# Altium footprint library FS_Footprints.PcbLib: 134 footprints (part 1 of 9)
Each footprint in its own frame and in the unit in brackets; x right, y up, seen from the top. Pads: shape width x height; smd on the part's side, far side on the other; paste and mask are expansions set on the pad; w line width, h text height; cw(c..) or ccw(c..) is an arc to the next point about the centre after c.
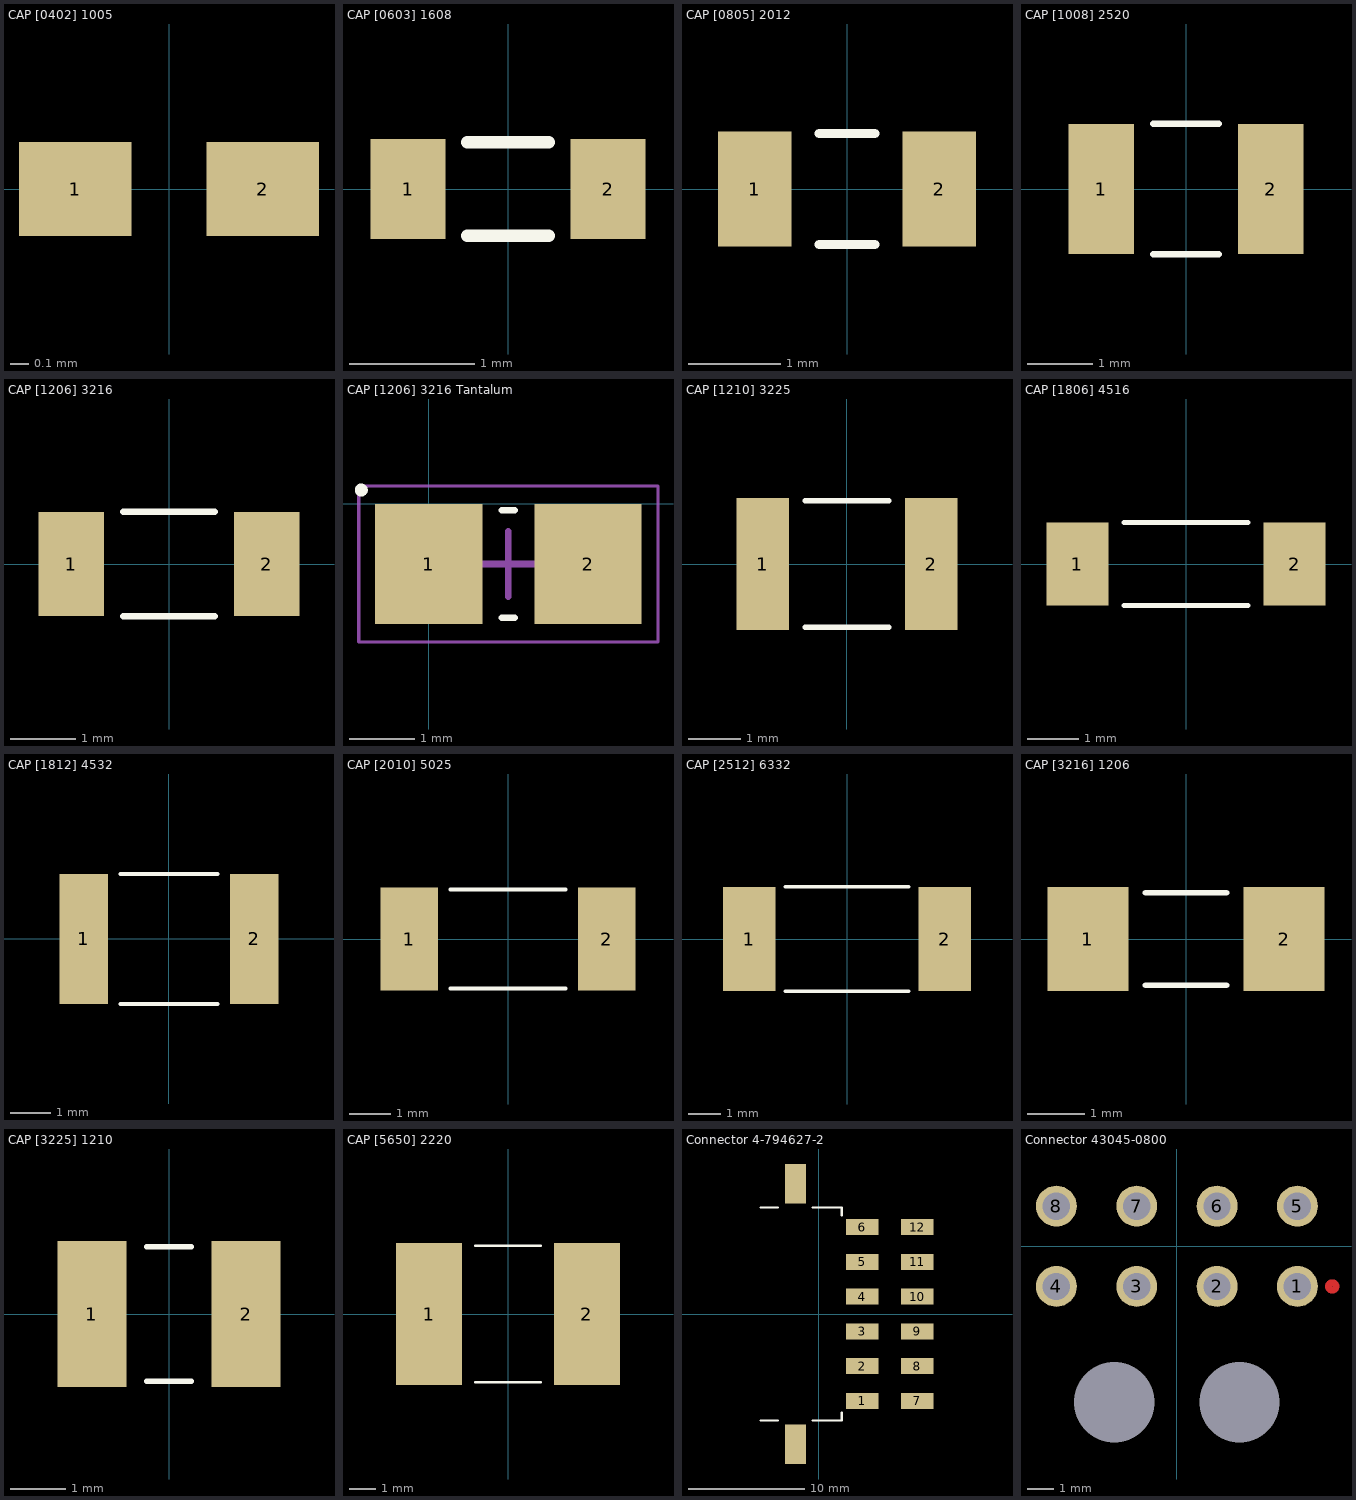
[diagram p0: the footprints below, top view; thin cyan lines are the x and y axes]

## CAP [0402] 1005 [mm]
pads (2):
  rect 0.6x0.5 smd: 1(-0.5,0) 2(0.5,0)
3D body "User Library-SMD CAPACITOR 0402.step": height 0.49, standoff -0.01, extent -0.5,-0.25 0.5,0.25

## CAP [0603] 1608 [mm]
pads (2):
  rect 0.6x0.8 smd: 1(-0.8,0) 2(0.8,0)
Top Overlay:
  lines w0.1: -0.325,-0.375 0.325,-0.375 ; -0.325,0.375 0.325,0.375
3D body "User Library-CerCaps 0603.step": height 0.81, standoff -0.01, extent -0.93,-0.412 0.93,0.413

## CAP [0805] 2012 [mm]
pads (2):
  rect 0.8x1.25 smd: 1(-1,0) 2(1,0)
Top Overlay:
  lines w0.1: -0.3,-0.6 0.3,-0.6 ; -0.3,0.6 0.3,0.6
3D body "User Library-CerCaps 0805.step": height 1.26, standoff -0.01, extent -1.088,-0.637 1.088,0.638

## CAP [1008] 2520 [mm]
pads (2):
  rect 1x2 smd: 1(-1.3,0) 2(1.3,0)
Top Overlay:
  lines w0.1: -0.5,-1 0.5,-1 ; -0.5,1 0.5,1
3D body "User Library-CerCaps 1008.step": height 2.01, standoff -0.01, extent -1.367,-1.012 1.367,1.013

## CAP [1206] 3216 [mm]
pads (2):
  rect 1x1.6 smd: 1(-1.5,0) 2(1.5,0)
Top Overlay:
  lines w0.1: -0.7,-0.8 0.7,-0.8 ; -0.7,0.8 0.7,0.8
3D body "User Library-CerCaps 1206.step": height 1.61, standoff -0.01, extent -1.746,-0.812 1.747,0.813

## CAP [1206] 3216 Tantalum [mm] "Chip Capacitor, 2-Leads, Body 3.20x1.65mm, IPC Medium Density"
height 1.8
pads (2):
  rect 1.65x1.85 smd: 1(0,-0.925) 2(2.45,-0.925)
Top Overlay:
  circle w0.1: c-1.037,0.212 r0.05
  lines w0.1: 1.125,-1.75 1.325,-1.75 ; 1.125,-0.1 1.325,-0.1
Mechanical 15:
  lines w0.05: -1.075,-2.125 -1.075,0.275 3.525,0.275 3.525,-2.125 -1.075,-2.125
  lines w0.1: 0.725,-0.925 1.725,-0.925 ; 1.225,-1.425 1.225,-0.425

## CAP [1210] 3225 [mm]
pads (2):
  rect 1x2.5 smd: 1(-1.6,0) 2(1.6,0)
Top Overlay:
  lines w0.1: -0.8,-1.2 0.8,-1.2 ; -0.8,1.2 0.8,1.2
3D body "User Library-SMD CAPACITOR 1210.step": height 0.79, standoff 0.01, extent -1.6,-1.25 1.6,1.25

## CAP [1806] 4516 [mm]
pads (2):
  rect 1.2x1.6 smd: 1(-2.1,0) 2(2.1,0)
Top Overlay:
  lines w0.1: -1.2,-0.8 1.2,-0.8 ; -1.2,0.8 1.2,0.8
3D body "User Library-CerCaps 1806.step": height 1.61, standoff -0.01, extent -2.426,-0.812 2.426,0.813

## CAP [1812] 4532 [mm]
pads (2):
  rect 1.2x3.2 smd: 1(-2.1,0) 2(2.1,0)
Top Overlay:
  lines w0.1: -1.2,-1.6 1.2,-1.6 ; -1.2,1.6 1.2,1.6
3D body "User Library-CerCaps 1812.step": height 3.21, standoff -0.01, extent -2.46,-1.612 2.46,1.613

## CAP [2010] 5025 [mm]
pads (2):
  rect 1.4x2.5 smd: 1(-2.4,0) 2(2.4,0)
Top Overlay:
  lines w0.1: -1.4,-1.2 1.4,-1.2 ; -1.4,1.2 1.4,1.2
3D body "User Library-CerCaps 2010.step": height 2.51, standoff -0.01, extent -2.74,-1.262 2.74,1.263

## CAP [2512] 6332 [mm]
pads (2):
  rect 1.6x3.2 smd: 1(-3,0) 2(3,0)
Top Overlay:
  lines w0.1: -1.9,-1.6 1.9,-1.6 ; -1.9,1.6 1.9,1.6
3D body "User Library-CerCaps 2512.step": height 3.21, standoff -0.01, extent -3.47,-1.612 3.47,1.613

## CAP [3216] 1206 [mm]
height 1.5
pads (2):
  rect 1.4x1.8 smd: 1(-1.7,0) 2(1.7,0)
Top Overlay:
  lines w0.1: -0.7,-0.8 0.7,-0.8 ; -0.7,0.8 0.7,0.8
3D body "User Library-SMD CAPACITOR.step": height 0.79, standoff 0.01, extent -1.6,-0.8 1.6,0.8

## CAP [3225] 1210 [mm] "Chip Capacitor, 2-Leads, Body 3.20x2.50mm, IPC Medium Density"
height 1
pads (2):
  rect 1.25x2.65 smd: 1(-1.4,0) 2(1.4,0)
Top Overlay:
  lines w0.1: -0.4,-1.225 0.4,-1.225 ; -0.4,1.225 0.4,1.225
3D body "User Library-SMD CAPACITOR 1210.step": height 0.79, standoff 0.01, extent -1.6,-1.25 1.6,1.25

## CAP [5650] 2220 [mm]
height 3.3
pads (2):
  rect 2.5x5.4 smd: 1(-3,0) 2(3,0)
Top Overlay:
  lines w0.1: -1.25,-2.6 1.25,-2.6 ; -1.25,2.6 1.25,2.6
3D body "User Library-SMD CAPACITOR 2220.step": height 1, standoff 0, extent -2.8,-2.5 2.8,2.5

## Connector 4-794627-2 [mm] "TE micro mnl 6x2 smd right angle"
pads (14):
  rect 2.8x1.4 smd: 1(3.75,-7.5) 2(3.75,-4.5) 3(3.75,-1.5) 4(3.75,1.5) 5(3.75,4.5) 6(3.75,7.5) 7(8.5,-7.5) 8(8.5,-4.5) 9(8.5,-1.5) 10(8.5,1.5) 11(8.5,4.5) 12(8.5,7.5)
  rect 1.8x3.4 smd: ""(-2,-11.25) ""(-2,11.25)
Top Overlay:
  lines w0.2: -5,-9.2 -3.5,-9.2 ; -5,9.2 -3.5,9.2 ; -0.5,-9.2 2,-9.2 2,-8.5 ; -0.5,9.2 2,9.2 2,8.5
3D body "c-4-794627-2-j-3d.stp": height 8.63, standoff -0.04, extent -6.63,-12.555 9,12.555

## Connector 43045-0800 [mm]
height 8.77
pads (10):
  round 1.524 hole 1.02: 1(4.5,-1.5) 2(1.5,-1.5) 3(-1.5,-1.5) 4(-4.5,-1.5) 5(4.5,1.5) 6(1.5,1.5) 7(-1.5,1.5) 8(-4.5,1.5)
  round 1.6 hole 3: ""(-2.34,-5.82) ""(2.34,-5.82)
Top Layer:
  circle w0.254: c5.8,-1.5 r0.141
3D body: height 0.32, standoff -0.32, extent 0,0 0,0
3D body "User Library-430450800.step": height 8.75, standoff -3.19, extent -8.075,-10.4 8.075,1.84
3D body: height 0.32, standoff -0.32, extent 0.2,5 0.2,5
3D body: height 0.32, standoff -0.32, extent 1.2,4.2 1.2,4.2
3D body: height 0.32, standoff -0.32, extent 1.5,4.5 1.5,4.5